# Altium footprint library IC.PcbLib: 386 footprints (part 4 of 30)
Each footprint in its own frame and in the unit in brackets; x right, y up, seen from the top. Pads: shape width x height; smd on the part's side, far side on the other; paste and mask are expansions set on the pad; w line width, h text height; cw(c..) or ccw(c..) is an arc to the next point about the centre after c.
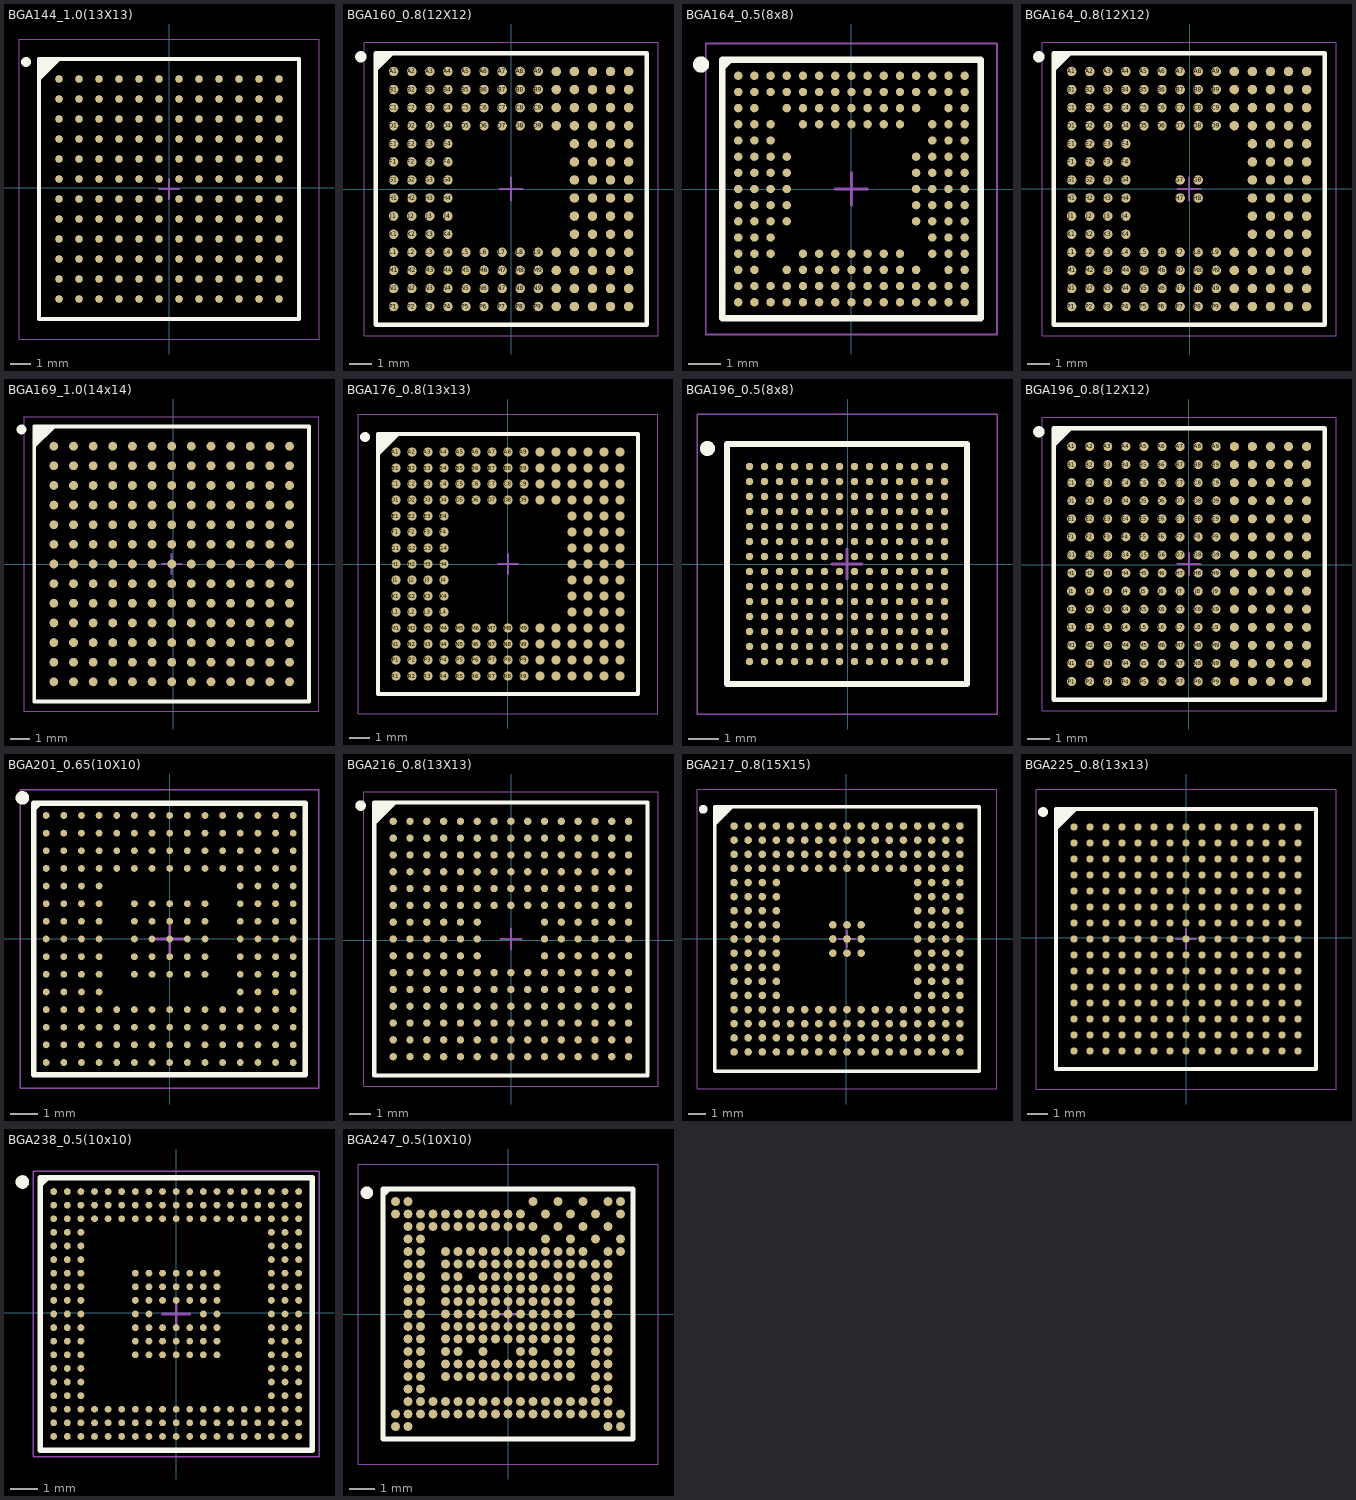
[diagram p3: the footprints below, top view; thin cyan lines are the x and y axes]

## BGA144_1.0(13X13) [mm]
pads (144):
  round 0.38 smd: A1(-5.5,5.449) A2(-4.5,5.449) A3(-3.5,5.449) A4(-2.5,5.449) A5(-1.5,5.449) A6(-0.5,5.449) A7(0.5,5.449) A8(1.5,5.449) A9(2.5,5.449) A10(3.5,5.449) A11(4.5,5.449) A12(5.5,5.449) B1(-5.5,4.449) B2(-4.5,4.449) B3(-3.5,4.449) B4(-2.5,4.449) B5(-1.5,4.449) B6(-0.5,4.449) B7(0.5,4.449) B8(1.5,4.449) B9(2.5,4.449) B10(3.5,4.449) B11(4.5,4.449) B12(5.5,4.449) C1(-5.5,3.449) C2(-4.5,3.449) C3(-3.5,3.449) C4(-2.5,3.449) C5(-1.5,3.449) C6(-0.5,3.449) C7(0.5,3.449) C8(1.5,3.449) C9(2.5,3.449) C10(3.5,3.449) C11(4.5,3.449) C12(5.5,3.449) D1(-5.5,2.449) D2(-4.5,2.449) D3(-3.5,2.449) D4(-2.5,2.449) D5(-1.5,2.449) D6(-0.5,2.449) D7(0.5,2.449) D8(1.5,2.449) D9(2.5,2.449) D10(3.5,2.449) D11(4.5,2.449) D12(5.5,2.449) E1(-5.5,1.449) E2(-4.5,1.449) E3(-3.5,1.449) E4(-2.5,1.449) E5(-1.5,1.449) E6(-0.5,1.449) E7(0.5,1.449) E8(1.5,1.449) E9(2.5,1.449) E10(3.5,1.449) E11(4.5,1.449) E12(5.5,1.449) F1(-5.5,0.449) F2(-4.5,0.449) F3(-3.5,0.449) F4(-2.5,0.449) F5(-1.5,0.449) F6(-0.5,0.449) F7(0.5,0.449) F8(1.5,0.449) F9(2.5,0.449) F10(3.5,0.449) F11(4.5,0.449) F12(5.5,0.449) G1(-5.5,-0.551) G2(-4.5,-0.551) G3(-3.5,-0.551) G4(-2.5,-0.551) G5(-1.5,-0.551) G6(-0.5,-0.551) G7(0.5,-0.551) G8(1.5,-0.551) G9(2.5,-0.551) G10(3.5,-0.551) G11(4.5,-0.551) G12(5.5,-0.551) H1(-5.5,-1.551) H2(-4.5,-1.551) H3(-3.5,-1.551) H4(-2.5,-1.551) H5(-1.5,-1.551) H6(-0.5,-1.551) H7(0.5,-1.551) H8(1.5,-1.551) H9(2.5,-1.551) H10(3.5,-1.551) H11(4.5,-1.551) H12(5.5,-1.551) J1(-5.5,-2.551) J2(-4.5,-2.551) J3(-3.5,-2.551) J4(-2.5,-2.551) J5(-1.5,-2.551) J6(-0.5,-2.551) J7(0.5,-2.551) J8(1.5,-2.551) J9(2.5,-2.551) J10(3.5,-2.551) J11(4.5,-2.551) J12(5.5,-2.551) K1(-5.5,-3.551) K2(-4.5,-3.551) K3(-3.5,-3.551) K4(-2.5,-3.551) K5(-1.5,-3.551) K6(-0.5,-3.551) K7(0.5,-3.551) K8(1.5,-3.551) K9(2.5,-3.551) K10(3.5,-3.551) K11(4.5,-3.551) K12(5.5,-3.551) L1(-5.5,-4.551) L2(-4.5,-4.551) L3(-3.5,-4.551) L4(-2.5,-4.551) L5(-1.5,-4.551) L6(-0.5,-4.551) L7(0.5,-4.551) L8(1.5,-4.551) L9(2.5,-4.551) L10(3.5,-4.551) L11(4.5,-4.551) L12(5.5,-4.551) M1(-5.5,-5.551) M2(-4.5,-5.551) M3(-3.5,-5.551) M4(-2.5,-5.551) M5(-1.5,-5.551) M6(-0.5,-5.551) M7(0.5,-5.551) M8(1.5,-5.551) M9(2.5,-5.551) M10(3.5,-5.551) M11(4.5,-5.551) M12(5.5,-5.551)
Top Overlay:
  circle w0.25: c-7.15,6.299 r0.125
  region: -5.5,6.449 -6.5,5.449 -6.5,6.449
  lines w0.2: -6.5,5.449 -5.5,6.449 ; -6.5,-6.551 -6.5,6.449 6.5,6.449 6.5,-6.551 -6.5,-6.551
Mechanical 13:
  lines w0.1: -6.5,-6.551 -6.5,6.449 6.5,6.449 6.5,-6.551 -6.5,-6.551
Mechanical 15:
  lines w0.05: -7.5,-7.551 -7.5,7.449 7.5,7.449 7.5,-7.551 -7.5,-7.551
  lines w0.1: -0.5,-0.051 0.5,-0.051 ; 0,-0.551 0,0.449
3D body "BGA144C100P12X12_1300X1300X100.step": height 1, standoff 0, extent -6.5,-6.551 6.5,6.449

## BGA160_0.8(12X12) [mm]
pads (160):
  round 0.42 smd: A1(-5.2,5.2) A2(-4.4,5.2) A3(-3.6,5.2) A4(-2.8,5.2) A5(-2,5.2) A6(-1.2,5.2) A7(-0.4,5.2) A8(0.4,5.2) A9(1.2,5.2) A10(2,5.2) A11(2.8,5.2) A12(3.6,5.2) A13(4.4,5.2) A14(5.2,5.2) B1(-5.2,4.4) B2(-4.4,4.4) B3(-3.6,4.4) B4(-2.8,4.4) B5(-2,4.4) B6(-1.2,4.4) B7(-0.4,4.4) B8(0.4,4.4) B9(1.2,4.4) B10(2,4.4) B11(2.8,4.4) B12(3.6,4.4) B13(4.4,4.4) B14(5.2,4.4) C1(-5.2,3.6) C2(-4.4,3.6) C3(-3.6,3.6) C4(-2.8,3.6) C5(-2,3.6) C6(-1.2,3.6) C7(-0.4,3.6) C8(0.4,3.6) C9(1.2,3.6) C10(2,3.6) C11(2.8,3.6) C12(3.6,3.6) C13(4.4,3.6) C14(5.2,3.6) D1(-5.2,2.8) D2(-4.4,2.8) D3(-3.6,2.8) D4(-2.8,2.8) D5(-2,2.8) D6(-1.2,2.8) D7(-0.4,2.8) D8(0.4,2.8) D9(1.2,2.8) D10(2,2.8) D11(2.8,2.8) D12(3.6,2.8) D13(4.4,2.8) D14(5.2,2.8) E1(-5.2,2) E2(-4.4,2) E3(-3.6,2) E4(-2.8,2) E11(2.8,2) E12(3.6,2) E13(4.4,2) E14(5.2,2) F1(-5.2,1.2) F2(-4.4,1.2) F3(-3.6,1.2) F4(-2.8,1.2) F11(2.8,1.2) F12(3.6,1.2) F13(4.4,1.2) F14(5.2,1.2) G1(-5.2,0.4) G2(-4.4,0.4) G3(-3.6,0.4) G4(-2.8,0.4) G11(2.8,0.4) G12(3.6,0.4) G13(4.4,0.4) G14(5.2,0.4) H1(-5.2,-0.4) H2(-4.4,-0.4) H3(-3.6,-0.4) H4(-2.8,-0.4) H11(2.8,-0.4) H12(3.6,-0.4) H13(4.4,-0.4) H14(5.2,-0.4) J1(-5.2,-1.2) J2(-4.4,-1.2) J3(-3.6,-1.2) J4(-2.8,-1.2) J11(2.8,-1.2) J12(3.6,-1.2) J13(4.4,-1.2) J14(5.2,-1.2) K1(-5.2,-2) K2(-4.4,-2) K3(-3.6,-2) K4(-2.8,-2) K11(2.8,-2) K12(3.6,-2) K13(4.4,-2) K14(5.2,-2) L1(-5.2,-2.8) L2(-4.4,-2.8) L3(-3.6,-2.8) L4(-2.8,-2.8) L5(-2,-2.8) L6(-1.2,-2.8) L7(-0.4,-2.8) L8(0.4,-2.8) L9(1.2,-2.8) L10(2,-2.8) L11(2.8,-2.8) L12(3.6,-2.8) L13(4.4,-2.8) L14(5.2,-2.8) M1(-5.2,-3.6) M2(-4.4,-3.6) M3(-3.6,-3.6) M4(-2.8,-3.6) M5(-2,-3.6) M6(-1.2,-3.6) M7(-0.4,-3.6) M8(0.4,-3.6) M9(1.2,-3.6) M10(2,-3.6) M11(2.8,-3.6) M12(3.6,-3.6) M13(4.4,-3.6) M14(5.2,-3.6) N1(-5.2,-4.4) N2(-4.4,-4.4) N3(-3.6,-4.4) N4(-2.8,-4.4) N5(-2,-4.4) N6(-1.2,-4.4) N7(-0.4,-4.4) N8(0.4,-4.4) N9(1.2,-4.4) N10(2,-4.4) N11(2.8,-4.4) N12(3.6,-4.4) N13(4.4,-4.4) N14(5.2,-4.4) P1(-5.2,-5.2) P2(-4.4,-5.2) P3(-3.6,-5.2) P4(-2.8,-5.2) P5(-2,-5.2) P6(-1.2,-5.2) P7(-0.4,-5.2) P8(0.4,-5.2) P9(1.2,-5.2) P10(2,-5.2) P11(2.8,-5.2) P12(3.6,-5.2) P13(4.4,-5.2) P14(5.2,-5.2)
Top Overlay:
  circle w0.25: c-6.65,5.85 r0.125
  region: -5.284,6 -6,5.284 -6,6
  lines w0.2: -6,5.284 -5.284,6 ; -6,-6 6,-6 6,6 -6,6 -6,-6
Mechanical 13:
  lines w0.1: -6,-6 6,-6 6,6 -6,6 -6,-6
Mechanical 15:
  lines w0.05: -6.5,-6.5 6.5,-6.5 6.5,6.5 -6.5,6.5 -6.5,-6.5
  lines w0.1: -0.5,0 0.5,0 ; 0,-0.5 0,0.5
3D body: height 1.4, standoff 0.25, extent -6,-6 6,6

## BGA164_0.5(8x8) [mm]
pads (164):
  round 0.26 smd: A1(-3.5,3.5) A2(-3,3.5) A3(-2.5,3.5) A4(-2,3.5) A5(-1.5,3.5) A6(-1,3.5) A7(-0.5,3.5) A8(0,3.5) A9(0.5,3.5) A10(1,3.5) A11(1.5,3.5) A12(2,3.5) A13(2.5,3.5) A14(3,3.5) A15(3.5,3.5) B1(-3.5,3) B2(-3,3) B3(-2.5,3) B4(-2,3) B5(-1.5,3) B6(-1,3) B7(-0.5,3) B8(0,3) B9(0.5,3) B10(1,3) B11(1.5,3) B12(2,3) B13(2.5,3) B14(3,3) B15(3.5,3) C1(-3.5,2.5) C2(-3,2.5) C4(-2,2.5) C5(-1.5,2.5) C6(-1,2.5) C7(-0.5,2.5) C8(0,2.5) C9(0.5,2.5) C10(1,2.5) C11(1.5,2.5) C12(2,2.5) C14(3,2.5) C15(3.5,2.5) D1(-3.5,2) D2(-3,2) D3(-2.5,2) D5(-1.5,2) D6(-1,2) D7(-0.5,2) D8(0,2) D9(0.5,2) D10(1,2) D11(1.5,2) D13(2.5,2) D14(3,2) D15(3.5,2) E1(-3.5,1.5) E2(-3,1.5) E3(-2.5,1.5) E13(2.5,1.5) E14(3,1.5) E15(3.5,1.5) F1(-3.5,1) F2(-3,1) F3(-2.5,1) F4(-2,1) F12(2,1) F13(2.5,1) F14(3,1) F15(3.5,1) G1(-3.5,0.5) G2(-3,0.5) G3(-2.5,0.5) G4(-2,0.5) G12(2,0.5) G13(2.5,0.5) G14(3,0.5) G15(3.5,0.5) H1(-3.5,0) H2(-3,0) H3(-2.5,0) H4(-2,0) H12(2,0) H13(2.5,0) H14(3,0) H15(3.5,0) J1(-3.5,-0.5) J2(-3,-0.5) J3(-2.5,-0.5) J4(-2,-0.5) J12(2,-0.5) J13(2.5,-0.5) J14(3,-0.5) J15(3.5,-0.5) K1(-3.5,-1) K2(-3,-1) K3(-2.5,-1) K4(-2,-1) K12(2,-1) K13(2.5,-1) K14(3,-1) K15(3.5,-1) L1(-3.5,-1.5) L2(-3,-1.5) L3(-2.5,-1.5) L13(2.5,-1.5) L14(3,-1.5) L15(3.5,-1.5) M1(-3.5,-2) M2(-3,-2) M3(-2.5,-2) M5(-1.5,-2) M6(-1,-2) M7(-0.5,-2) M8(0,-2) M9(0.5,-2) M10(1,-2) M11(1.5,-2) M13(2.5,-2) M14(3,-2) M15(3.5,-2) N1(-3.5,-2.5) N2(-3,-2.5) N4(-2,-2.5) N5(-1.5,-2.5) N6(-1,-2.5) N7(-0.5,-2.5) N8(0,-2.5) N9(0.5,-2.5) N10(1,-2.5) N11(1.5,-2.5) N12(2,-2.5) N14(3,-2.5) N15(3.5,-2.5) P1(-3.5,-3) P2(-3,-3) P3(-2.5,-3) P4(-2,-3) P5(-1.5,-3) P6(-1,-3) P7(-0.5,-3) P8(0,-3) P9(0.5,-3) P10(1,-3) P11(1.5,-3) P12(2,-3) P13(2.5,-3) P14(3,-3) P15(3.5,-3) R1(-3.5,-3.5) R2(-3,-3.5) R3(-2.5,-3.5) R4(-2,-3.5) R5(-1.5,-3.5) R6(-1,-3.5) R7(-0.5,-3.5) R8(0,-3.5) R9(0.5,-3.5) R10(1,-3.5) R11(1.5,-3.5) R12(2,-3.5) R13(2.5,-3.5) R14(3,-3.5) R15(3.5,-3.5)
Top Overlay:
  circle w0.25: c-4.65,3.85 r0.125
  region: -3.75,4 -4,3.75 -4,4
  lines w0.2: -4,3.75 -3.75,4 ; -4,-4 -4,4 4,4 4,-4 -4,-4
Mechanical 13:
  lines w0.1: -4,-4 -4,4 4,4 4,-4 -4,-4
Mechanical 15:
  lines w0.05: -4.5,-4.5 -4.5,4.5 4.5,4.5 4.5,-4.5 -4.5,-4.5
  lines w0.1: -0.5,0 0.5,0 ; 0,-0.5 0,0.5
3D body: height 1.25, standoff 0.2, extent -3.267,2.42 -2.47,3.219
3D body: height 1.2, standoff 0.15, extent -3.999,-3.999 3.999,3.999

## BGA164_0.8(12X12) [mm]
pads (164):
  round 0.42 smd: A1(-5.232,5.181) A2(-4.432,5.181) A3(-3.632,5.181) A4(-2.832,5.181) A5(-2.032,5.181) A6(-1.232,5.181) A7(-0.432,5.181) A8(0.368,5.181) A9(1.168,5.181) A10(1.968,5.181) A11(2.768,5.181) A12(3.568,5.181) A13(4.368,5.181) A14(5.168,5.181) B1(-5.232,4.381) B2(-4.432,4.381) B3(-3.632,4.381) B4(-2.832,4.381) B5(-2.032,4.381) B6(-1.232,4.381) B7(-0.432,4.381) B8(0.368,4.381) B9(1.168,4.381) B10(1.968,4.381) B11(2.768,4.381) B12(3.568,4.381) B13(4.368,4.381) B14(5.168,4.381) C1(-5.232,3.581) C2(-4.432,3.581) C3(-3.632,3.581) C4(-2.832,3.581) C5(-2.032,3.581) C6(-1.232,3.581) C7(-0.432,3.581) C8(0.368,3.581) C9(1.168,3.581) C10(1.968,3.581) C11(2.768,3.581) C12(3.568,3.581) C13(4.368,3.581) C14(5.168,3.581) D1(-5.232,2.781) D2(-4.432,2.781) D3(-3.632,2.781) D4(-2.832,2.781) D5(-2.032,2.781) D6(-1.232,2.781) D7(-0.432,2.781) D8(0.368,2.781) D9(1.168,2.781) D10(1.968,2.781) D11(2.768,2.781) D12(3.568,2.781) D13(4.368,2.781) D14(5.168,2.781) E1(-5.232,1.981) E2(-4.432,1.981) E3(-3.632,1.981) E4(-2.832,1.981) E11(2.768,1.981) E12(3.568,1.981) E13(4.368,1.981) E14(5.168,1.981) F1(-5.232,1.181) F2(-4.432,1.181) F3(-3.632,1.181) F4(-2.832,1.181) F11(2.768,1.181) F12(3.568,1.181) F13(4.368,1.181) F14(5.168,1.181) G1(-5.232,0.381) G2(-4.432,0.381) G3(-3.632,0.381) G4(-2.832,0.381) G7(-0.432,0.381) G8(0.368,0.381) G11(2.768,0.381) G12(3.568,0.381) G13(4.368,0.381) G14(5.168,0.381) H1(-5.232,-0.419) H2(-4.432,-0.419) H3(-3.632,-0.419) H4(-2.832,-0.419) H7(-0.432,-0.419) H8(0.368,-0.419) H11(2.768,-0.419) H12(3.568,-0.419) H13(4.368,-0.419) H14(5.168,-0.419) J1(-5.232,-1.219) J2(-4.432,-1.219) J3(-3.632,-1.219) J4(-2.832,-1.219) J11(2.768,-1.219) J12(3.568,-1.219) J13(4.368,-1.219) J14(5.168,-1.219) K1(-5.232,-2.019) K2(-4.432,-2.019) K3(-3.632,-2.019) K4(-2.832,-2.019) K11(2.768,-2.019) K12(3.568,-2.019) K13(4.368,-2.019) K14(5.168,-2.019) L1(-5.232,-2.819) L2(-4.432,-2.819) L3(-3.632,-2.819) L4(-2.832,-2.819) L5(-2.032,-2.819) L6(-1.232,-2.819) L7(-0.432,-2.819) L8(0.368,-2.819) L9(1.168,-2.819) L10(1.968,-2.819) L11(2.768,-2.819) L12(3.568,-2.819) L13(4.368,-2.819) L14(5.168,-2.819) M1(-5.232,-3.619) M2(-4.432,-3.619) M3(-3.632,-3.619) M4(-2.832,-3.619) M5(-2.032,-3.619) M6(-1.232,-3.619) M7(-0.432,-3.619) M8(0.368,-3.619) M9(1.168,-3.619) M10(1.968,-3.619) M11(2.768,-3.619) M12(3.568,-3.619) M13(4.368,-3.619) M14(5.168,-3.619) N1(-5.232,-4.419) N2(-4.432,-4.419) N3(-3.632,-4.419) N4(-2.832,-4.419) N5(-2.032,-4.419) N6(-1.232,-4.419) N7(-0.432,-4.419) N8(0.368,-4.419) N9(1.168,-4.419) N10(1.968,-4.419) N11(2.768,-4.419) N12(3.568,-4.419) N13(4.368,-4.419) N14(5.168,-4.419) P1(-5.232,-5.219) P2(-4.432,-5.219) P3(-3.632,-5.219) P4(-2.832,-5.219) P5(-2.032,-5.219) P6(-1.232,-5.219) P7(-0.432,-5.219) P8(0.368,-5.219) P9(1.168,-5.219) P10(1.968,-5.219) P11(2.768,-5.219) P12(3.568,-5.219) P13(4.368,-5.219) P14(5.168,-5.219)
Top Overlay:
  circle w0.25: c-6.682,5.831 r0.125
  region: -5.316,5.981 -6.032,5.265 -6.032,5.981
  lines w0.2: -6.032,5.265 -5.316,5.981 ; -6.032,-6.019 -6.032,5.981 5.968,5.981 5.968,-6.019 -6.032,-6.019
Mechanical 13:
  lines w0.1: -6.032,-6.019 -6.032,5.981 5.968,5.981 5.968,-6.019 -6.032,-6.019
Mechanical 15:
  lines w0.05: -6.532,-6.519 -6.532,6.481 6.468,6.481 6.468,-6.519 -6.532,-6.519
  lines w0.1: -0.532,-0.019 0.468,-0.019 ; -0.032,-0.519 -0.032,0.481
3D body: height 1.35, standoff 0.3, extent -5.375,4.427 -4.578,5.225
3D body: height 1.3, standoff 0.28, extent -6.032,-6.019 5.968,5.981

## BGA169_1.0(14x14) [mm]
height 0.65
pads (169):
  round 0.45 smd: A1(-6.076,6) A2(-5.076,6) A3(-4.076,6) A4(-3.076,6) A5(-2.076,6) A6(-1.076,6) A7(-0.076,6) A8(0.924,6) A9(1.924,6) A10(2.924,6) A11(3.924,6) A12(4.924,6) A13(5.924,6) B1(-6.076,5) B2(-5.076,5) B3(-4.076,5) B4(-3.076,5) B5(-2.076,5) B6(-1.076,5) B7(-0.076,5) B8(0.924,5) B9(1.924,5) B10(2.924,5) B11(3.924,5) B12(4.924,5) B13(5.924,5) C1(-6.076,4) C2(-5.076,4) C3(-4.076,4) C4(-3.076,4) C5(-2.076,4) C6(-1.076,4) C7(-0.076,4) C8(0.924,4) C9(1.924,4) C10(2.924,4) C11(3.924,4) C12(4.924,4) C13(5.924,4) D1(-6.076,3) D2(-5.076,3) D3(-4.076,3) D4(-3.076,3) D5(-2.076,3) D6(-1.076,3) D7(-0.076,3) D8(0.924,3) D9(1.924,3) D10(2.924,3) D11(3.924,3) D12(4.924,3) D13(5.924,3) E1(-6.076,2) E2(-5.076,2) E3(-4.076,2) E4(-3.076,2) E5(-2.076,2) E6(-1.076,2) E7(-0.076,2) E8(0.924,2) E9(1.924,2) E10(2.924,2) E11(3.924,2) E12(4.924,2) E13(5.924,2) F1(-6.076,1) F2(-5.076,1) F3(-4.076,1) F4(-3.076,1) F5(-2.076,1) F6(-1.076,1) F7(-0.076,1) F8(0.924,1) F9(1.924,1) F10(2.924,1) F11(3.924,1) F12(4.924,1) F13(5.924,1) G1(-6.076,0) G2(-5.076,0) G3(-4.076,0) G4(-3.076,0) G5(-2.076,0) G6(-1.076,0) G7(-0.076,0) G8(0.924,0) G9(1.924,0) G10(2.924,0) G11(3.924,0) G12(4.924,0) G13(5.924,0) H1(-6.076,-1) H2(-5.076,-1) H3(-4.076,-1) H4(-3.076,-1) H5(-2.076,-1) H6(-1.076,-1) H7(-0.076,-1) H8(0.924,-1) H9(1.924,-1) H10(2.924,-1) H11(3.924,-1) H12(4.924,-1) H13(5.924,-1) J1(-6.076,-2) J2(-5.076,-2) J3(-4.076,-2) J4(-3.076,-2) J5(-2.076,-2) J6(-1.076,-2) J7(-0.076,-2) J8(0.924,-2) J9(1.924,-2) J10(2.924,-2) J11(3.924,-2) J12(4.924,-2) J13(5.924,-2) K1(-6.076,-3) K2(-5.076,-3) K3(-4.076,-3) K4(-3.076,-3) K5(-2.076,-3) K6(-1.076,-3) K7(-0.076,-3) K8(0.924,-3) K9(1.924,-3) K10(2.924,-3) K11(3.924,-3) K12(4.924,-3) K13(5.924,-3) L1(-6.076,-4) L2(-5.076,-4) L3(-4.076,-4) L4(-3.076,-4) L5(-2.076,-4) L6(-1.076,-4) L7(-0.076,-4) L8(0.924,-4) L9(1.924,-4) L10(2.924,-4) L11(3.924,-4) L12(4.924,-4) L13(5.924,-4) M1(-6.076,-5) M2(-5.076,-5) M3(-4.076,-5) M4(-3.076,-5) M5(-2.076,-5) M6(-1.076,-5) M7(-0.076,-5) M8(0.924,-5) M9(1.924,-5) M10(2.924,-5) M11(3.924,-5) M12(4.924,-5) M13(5.924,-5) N1(-6.076,-6) N2(-5.076,-6) N3(-4.076,-6) N4(-3.076,-6) N5(-2.076,-6) N6(-1.076,-6) N7(-0.076,-6) N8(0.924,-6) N9(1.924,-6) N10(2.924,-6) N11(3.924,-6) N12(4.924,-6) N13(5.924,-6)
Top Overlay:
  circle w0.25: c-7.726,6.85 r0.125
  region: -6.076,7 -7.076,6 -7.076,7
  lines w0.2: -7.076,6 -6.076,7 ; -7.076,-7 -7.076,7 6.924,7 6.924,-7 -7.076,-7
Mechanical 13:
  lines w0.1: -7.076,-7 -7.076,7 6.924,7 6.924,-7 -7.076,-7
Mechanical 15:
  lines w0.05: -7.576,-7.5 -7.576,7.5 7.424,7.5 7.424,-7.5 -7.576,-7.5
  lines w0.1: -0.576,0 0.424,0 ; -0.076,-0.5 -0.076,0.5
3D body "BGA169C100P13X13_1400X1400X155.step": height 1.55, standoff 0, extent -7.051,-6.949 6.949,7.051

## BGA176_0.8(13x13) [mm]
pads (176):
  round 0.45 smd: A1(-5.6,5.6) A2(-4.8,5.6) A3(-4,5.6) A4(-3.2,5.6) A5(-2.4,5.6) A6(-1.6,5.6) A7(-0.8,5.6) A8(0,5.6) A9(0.8,5.6) A10(1.6,5.6) A11(2.4,5.6) A12(3.2,5.6) A13(4,5.6) A14(4.8,5.6) A15(5.6,5.6) B1(-5.6,4.8) B2(-4.8,4.8) B3(-4,4.8) B4(-3.2,4.8) B5(-2.4,4.8) B6(-1.6,4.8) B7(-0.8,4.8) B8(0,4.8) B9(0.8,4.8) B10(1.6,4.8) B11(2.4,4.8) B12(3.2,4.8) B13(4,4.8) B14(4.8,4.8) B15(5.6,4.8) C1(-5.6,4) C2(-4.8,4) C3(-4,4) C4(-3.2,4) C5(-2.4,4) C6(-1.6,4) C7(-0.8,4) C8(0,4) C9(0.8,4) C10(1.6,4) C11(2.4,4) C12(3.2,4) C13(4,4) C14(4.8,4) C15(5.6,4) D1(-5.6,3.2) D2(-4.8,3.2) D3(-4,3.2) D4(-3.2,3.2) D5(-2.4,3.2) D6(-1.6,3.2) D7(-0.8,3.2) D8(0,3.2) D9(0.8,3.2) D10(1.6,3.2) D11(2.4,3.2) D12(3.2,3.2) D13(4,3.2) D14(4.8,3.2) D15(5.6,3.2) E1(-5.6,2.4) E2(-4.8,2.4) E3(-4,2.4) E4(-3.2,2.4) E12(3.2,2.4) E13(4,2.4) E14(4.8,2.4) E15(5.6,2.4) F1(-5.6,1.6) F2(-4.8,1.6) F3(-4,1.6) F4(-3.2,1.6) F12(3.2,1.6) F13(4,1.6) F14(4.8,1.6) F15(5.6,1.6) G1(-5.6,0.8) G2(-4.8,0.8) G3(-4,0.8) G4(-3.2,0.8) G12(3.2,0.8) G13(4,0.8) G14(4.8,0.8) G15(5.6,0.8) H1(-5.6,0) H2(-4.8,0) H3(-4,0) H4(-3.2,0) H12(3.2,0) H13(4,0) H14(4.8,0) H15(5.6,0) J1(-5.6,-0.8) J2(-4.8,-0.8) J3(-4,-0.8) J4(-3.2,-0.8) J12(3.2,-0.8) J13(4,-0.8) J14(4.8,-0.8) J15(5.6,-0.8) K1(-5.6,-1.6) K2(-4.8,-1.6) K3(-4,-1.6) K4(-3.2,-1.6) K12(3.2,-1.6) K13(4,-1.6) K14(4.8,-1.6) K15(5.6,-1.6) L1(-5.6,-2.4) L2(-4.8,-2.4) L3(-4,-2.4) L4(-3.2,-2.4) L12(3.2,-2.4) L13(4,-2.4) L14(4.8,-2.4) L15(5.6,-2.4) M1(-5.6,-3.2) M2(-4.8,-3.2) M3(-4,-3.2) M4(-3.2,-3.2) M5(-2.4,-3.2) M6(-1.6,-3.2) M7(-0.8,-3.2) M8(0,-3.2) M9(0.8,-3.2) M10(1.6,-3.2) M11(2.4,-3.2) M12(3.2,-3.2) M13(4,-3.2) M14(4.8,-3.2) M15(5.6,-3.2) N1(-5.6,-4) N2(-4.8,-4) N3(-4,-4) N4(-3.2,-4) N5(-2.4,-4) N6(-1.6,-4) N7(-0.8,-4) N8(0,-4) N9(0.8,-4) N10(1.6,-4) N11(2.4,-4) N12(3.2,-4) N13(4,-4) N14(4.8,-4) N15(5.6,-4) P1(-5.6,-4.8) P2(-4.8,-4.8) P3(-4,-4.8) P4(-3.2,-4.8) P5(-2.4,-4.8) P6(-1.6,-4.8) P7(-0.8,-4.8) P8(0,-4.8) P9(0.8,-4.8) P10(1.6,-4.8) P11(2.4,-4.8) P12(3.2,-4.8) P13(4,-4.8) P14(4.8,-4.8) P15(5.6,-4.8) R1(-5.6,-5.6) R2(-4.8,-5.6) R3(-4,-5.6) R4(-3.2,-5.6) R5(-2.4,-5.6) R6(-1.6,-5.6) R7(-0.8,-5.6) R8(0,-5.6) R9(0.8,-5.6) R10(1.6,-5.6) R11(2.4,-5.6) R12(3.2,-5.6) R13(4,-5.6) R14(4.8,-5.6) R15(5.6,-5.6)
Top Overlay:
  circle w0.25: c-7.15,6.35 r0.125
  region: -5.5,6.5 -6.5,5.5 -6.5,6.5
  lines w0.2: -6.5,5.5 -5.5,6.5 ; -6.5,-6.5 6.5,-6.5 6.5,6.5 -6.5,6.5 -6.5,-6.5
Mechanical 13:
  lines w0.1: -6.5,-6.5 6.5,-6.5 6.5,6.5 -6.5,6.5 -6.5,-6.5
Mechanical 15:
  lines w0.05: -7.5,-7.5 7.5,-7.5 7.5,7.5 -7.5,7.5 -7.5,-7.5
  lines w0.1: -0.5,0 0.5,0 ; 0,-0.5 0,0.5
3D body: height 1.55, standoff 0.46, extent -5.705,4.91 -4.908,5.708
3D body: height 1.54, standoff 0.45, extent -6.5,-6.5 6.5,6.5

## BGA196_0.5(8x8) [mm]
pads (196):
  round 0.25 smd: A1(-3.275,3.25) A2(-2.775,3.25) A3(-2.275,3.25) A4(-1.775,3.25) A5(-1.275,3.25) A6(-0.775,3.25) A7(-0.275,3.25) A8(0.225,3.25) A9(0.725,3.25) A10(1.225,3.25) A11(1.725,3.25) A12(2.225,3.25) A13(2.725,3.25) A14(3.225,3.25) B1(-3.275,2.75) B2(-2.775,2.75) B3(-2.275,2.75) B4(-1.775,2.75) B5(-1.275,2.75) B6(-0.775,2.75) B7(-0.275,2.75) B8(0.225,2.75) B9(0.725,2.75) B10(1.225,2.75) B11(1.725,2.75) B12(2.225,2.75) B13(2.725,2.75) B14(3.225,2.75) C1(-3.275,2.25) C2(-2.775,2.25) C3(-2.275,2.25) C4(-1.775,2.25) C5(-1.275,2.25) C6(-0.775,2.25) C7(-0.275,2.25) C8(0.225,2.25) C9(0.725,2.25) C10(1.225,2.25) C11(1.725,2.25) C12(2.225,2.25) C13(2.725,2.25) C14(3.225,2.25) D1(-3.275,1.75) D2(-2.775,1.75) D3(-2.275,1.75) D4(-1.775,1.75) D5(-1.275,1.75) D6(-0.775,1.75) D7(-0.275,1.75) D8(0.225,1.75) D9(0.725,1.75) D10(1.225,1.75) D11(1.725,1.75) D12(2.225,1.75) D13(2.725,1.75) D14(3.225,1.75) E1(-3.275,1.25) E2(-2.775,1.25) E3(-2.275,1.25) E4(-1.775,1.25) E5(-1.275,1.25) E6(-0.775,1.25) E7(-0.275,1.25) E8(0.225,1.25) E9(0.725,1.25) E10(1.225,1.25) E11(1.725,1.25) E12(2.225,1.25) E13(2.725,1.25) E14(3.225,1.25) F1(-3.275,0.75) F2(-2.775,0.75) F3(-2.275,0.75) F4(-1.775,0.75) F5(-1.275,0.75) F6(-0.775,0.75) F7(-0.275,0.75) F8(0.225,0.75) F9(0.725,0.75) F10(1.225,0.75) F11(1.725,0.75) F12(2.225,0.75) F13(2.725,0.75) F14(3.225,0.75) G1(-3.275,0.25) G2(-2.775,0.25) G3(-2.275,0.25) G4(-1.775,0.25) G5(-1.275,0.25) G6(-0.775,0.25) G7(-0.275,0.25) G8(0.225,0.25) G9(0.725,0.25) G10(1.225,0.25) G11(1.725,0.25) G12(2.225,0.25) G13(2.725,0.25) G14(3.225,0.25) H1(-3.275,-0.25) H2(-2.775,-0.25) H3(-2.275,-0.25) H4(-1.775,-0.25) H5(-1.275,-0.25) H6(-0.775,-0.25) H7(-0.275,-0.25) H8(0.225,-0.25) H9(0.725,-0.25) H10(1.225,-0.25) H11(1.725,-0.25) H12(2.225,-0.25) H13(2.725,-0.25) H14(3.225,-0.25) J1(-3.275,-0.75) J2(-2.775,-0.75) J3(-2.275,-0.75) J4(-1.775,-0.75) J5(-1.275,-0.75) J6(-0.775,-0.75) J7(-0.275,-0.75) J8(0.225,-0.75) J9(0.725,-0.75) J10(1.225,-0.75) J11(1.725,-0.75) J12(2.225,-0.75) J13(2.725,-0.75) J14(3.225,-0.75) K1(-3.275,-1.25) K2(-2.775,-1.25) K3(-2.275,-1.25) K4(-1.775,-1.25) K5(-1.275,-1.25) K6(-0.775,-1.25) K7(-0.275,-1.25) K8(0.225,-1.25) K9(0.725,-1.25) K10(1.225,-1.25) K11(1.725,-1.25) K12(2.225,-1.25) K13(2.725,-1.25) K14(3.225,-1.25) L1(-3.275,-1.75) L2(-2.775,-1.75) L3(-2.275,-1.75) L4(-1.775,-1.75) L5(-1.275,-1.75) L6(-0.775,-1.75) L7(-0.275,-1.75) L8(0.225,-1.75) L9(0.725,-1.75) L10(1.225,-1.75) L11(1.725,-1.75) L12(2.225,-1.75) L13(2.725,-1.75) L14(3.225,-1.75) M1(-3.275,-2.25) M2(-2.775,-2.25) M3(-2.275,-2.25) M4(-1.775,-2.25) M5(-1.275,-2.25) M6(-0.775,-2.25) M7(-0.275,-2.25) M8(0.225,-2.25) M9(0.725,-2.25) M10(1.225,-2.25) M11(1.725,-2.25) M12(2.225,-2.25) M13(2.725,-2.25) M14(3.225,-2.25) N1(-3.275,-2.75) N2(-2.775,-2.75) N3(-2.275,-2.75) N4(-1.775,-2.75) N5(-1.275,-2.75) N6(-0.775,-2.75) N7(-0.275,-2.75) N8(0.225,-2.75) N9(0.725,-2.75) N10(1.225,-2.75) N11(1.725,-2.75) N12(2.225,-2.75) N13(2.725,-2.75) N14(3.225,-2.75) P1(-3.275,-3.25) P2(-2.775,-3.25) P3(-2.275,-3.25) P4(-1.775,-3.25) P5(-1.275,-3.25) P6(-0.775,-3.25) P7(-0.275,-3.25) P8(0.225,-3.25) P9(0.725,-3.25) P10(1.225,-3.25) P11(1.725,-3.25) P12(2.225,-3.25) P13(2.725,-3.25) P14(3.225,-3.25)
Top Overlay:
  circle w0.25: c-4.675,3.85 r0.125
  lines w0.2: -4.025,-4 3.975,-4 3.975,4 -4.025,4 -4.025,-4
Mechanical 13:
  lines w0.1: -4.025,-4 3.975,-4 3.975,4 -4.025,4 -4.025,-4
Mechanical 15:
  lines w0.05: -5.025,-5 4.975,-5 4.975,5 -5.025,5 -5.025,-5
  lines w0.1: -0.525,0 0.475,0 ; -0.025,-0.5 -0.025,0.5
3D body "BGA196C50P14X14_800X800X110.step": height 1.1, standoff 0, extent -4,-4 4,4

## BGA196_0.8(12X12) [mm]
pads (196):
  round 0.4 smd: A1(-5.175,5.225) A2(-4.375,5.225) A3(-3.575,5.225) A4(-2.775,5.225) A5(-1.975,5.225) A6(-1.175,5.225) A7(-0.375,5.225) A8(0.425,5.225) A9(1.225,5.225) A10(2.025,5.225) A11(2.825,5.225) A12(3.625,5.225) A13(4.425,5.225) A14(5.225,5.225) B1(-5.175,4.425) B2(-4.375,4.425) B3(-3.575,4.425) B4(-2.775,4.425) B5(-1.975,4.425) B6(-1.175,4.425) B7(-0.375,4.425) B8(0.425,4.425) B9(1.225,4.425) B10(2.025,4.425) B11(2.825,4.425) B12(3.625,4.425) B13(4.425,4.425) B14(5.225,4.425) C1(-5.175,3.625) C2(-4.375,3.625) C3(-3.575,3.625) C4(-2.775,3.625) C5(-1.975,3.625) C6(-1.175,3.625) C7(-0.375,3.625) C8(0.425,3.625) C9(1.225,3.625) C10(2.025,3.625) C11(2.825,3.625) C12(3.625,3.625) C13(4.425,3.625) C14(5.225,3.625) D1(-5.175,2.825) D2(-4.375,2.825) D3(-3.575,2.825) D4(-2.775,2.825) D5(-1.975,2.825) D6(-1.175,2.825) D7(-0.375,2.825) D8(0.425,2.825) D9(1.225,2.825) D10(2.025,2.825) D11(2.825,2.825) D12(3.625,2.825) D13(4.425,2.825) D14(5.225,2.825) E1(-5.175,2.025) E2(-4.375,2.025) E3(-3.575,2.025) E4(-2.775,2.025) E5(-1.975,2.025) E6(-1.175,2.025) E7(-0.375,2.025) E8(0.425,2.025) E9(1.225,2.025) E10(2.025,2.025) E11(2.825,2.025) E12(3.625,2.025) E13(4.425,2.025) E14(5.225,2.025) F1(-5.175,1.225) F2(-4.375,1.225) F3(-3.575,1.225) F4(-2.775,1.225) F5(-1.975,1.225) F6(-1.175,1.225) F7(-0.375,1.225) F8(0.425,1.225) F9(1.225,1.225) F10(2.025,1.225) F11(2.825,1.225) F12(3.625,1.225) F13(4.425,1.225) F14(5.225,1.225) G1(-5.175,0.425) G2(-4.375,0.425) G3(-3.575,0.425) G4(-2.775,0.425) G5(-1.975,0.425) G6(-1.175,0.425) G7(-0.375,0.425) G8(0.425,0.425) G9(1.225,0.425) G10(2.025,0.425) G11(2.825,0.425) G12(3.625,0.425) G13(4.425,0.425) G14(5.225,0.425) H1(-5.175,-0.375) H2(-4.375,-0.375) H3(-3.575,-0.375) H4(-2.775,-0.375) H5(-1.975,-0.375) H6(-1.175,-0.375) H7(-0.375,-0.375) H8(0.425,-0.375) H9(1.225,-0.375) H10(2.025,-0.375) H11(2.825,-0.375) H12(3.625,-0.375) H13(4.425,-0.375) H14(5.225,-0.375) J1(-5.175,-1.175) J2(-4.375,-1.175) J3(-3.575,-1.175) J4(-2.775,-1.175) J5(-1.975,-1.175) J6(-1.175,-1.175) J7(-0.375,-1.175) J8(0.425,-1.175) J9(1.225,-1.175) J10(2.025,-1.175) J11(2.825,-1.175) J12(3.625,-1.175) J13(4.425,-1.175) J14(5.225,-1.175) K1(-5.175,-1.975) K2(-4.375,-1.975) K3(-3.575,-1.975) K4(-2.775,-1.975) K5(-1.975,-1.975) K6(-1.175,-1.975) K7(-0.375,-1.975) K8(0.425,-1.975) K9(1.225,-1.975) K10(2.025,-1.975) K11(2.825,-1.975) K12(3.625,-1.975) K13(4.425,-1.975) K14(5.225,-1.975) L1(-5.175,-2.775) L2(-4.375,-2.775) L3(-3.575,-2.775) L4(-2.775,-2.775) L5(-1.975,-2.775) L6(-1.175,-2.775) L7(-0.375,-2.775) L8(0.425,-2.775) L9(1.225,-2.775) L10(2.025,-2.775) L11(2.825,-2.775) L12(3.625,-2.775) L13(4.425,-2.775) L14(5.225,-2.775) M1(-5.175,-3.575) M2(-4.375,-3.575) M3(-3.575,-3.575) M4(-2.775,-3.575) M5(-1.975,-3.575) M6(-1.175,-3.575) M7(-0.375,-3.575) M8(0.425,-3.575) M9(1.225,-3.575) M10(2.025,-3.575) M11(2.825,-3.575) M12(3.625,-3.575) M13(4.425,-3.575) M14(5.225,-3.575) N1(-5.175,-4.375) N2(-4.375,-4.375) N3(-3.575,-4.375) N4(-2.775,-4.375) N5(-1.975,-4.375) N6(-1.175,-4.375) N7(-0.375,-4.375) N8(0.425,-4.375) N9(1.225,-4.375) N10(2.025,-4.375) N11(2.825,-4.375) N12(3.625,-4.375) N13(4.425,-4.375) N14(5.225,-4.375) P1(-5.175,-5.175) P2(-4.375,-5.175) P3(-3.575,-5.175) P4(-2.775,-5.175) P5(-1.975,-5.175) P6(-1.175,-5.175) P7(-0.375,-5.175) P8(0.425,-5.175) P9(1.225,-5.175) P10(2.025,-5.175) P11(2.825,-5.175) P12(3.625,-5.175) P13(4.425,-5.175) P14(5.225,-5.175)